# Altium footprint library con-molex.PCBLIB: 368 footprints (part 8 of 26)
Each footprint in its own frame and in the unit in brackets; x right, y up, seen from the top. Pads: shape width x height; smd on the part's side, far side on the other; paste and mask are expansions set on the pad; w line width, h text height; cw(c..) or ccw(c..) is an arc to the next point about the centre after c.
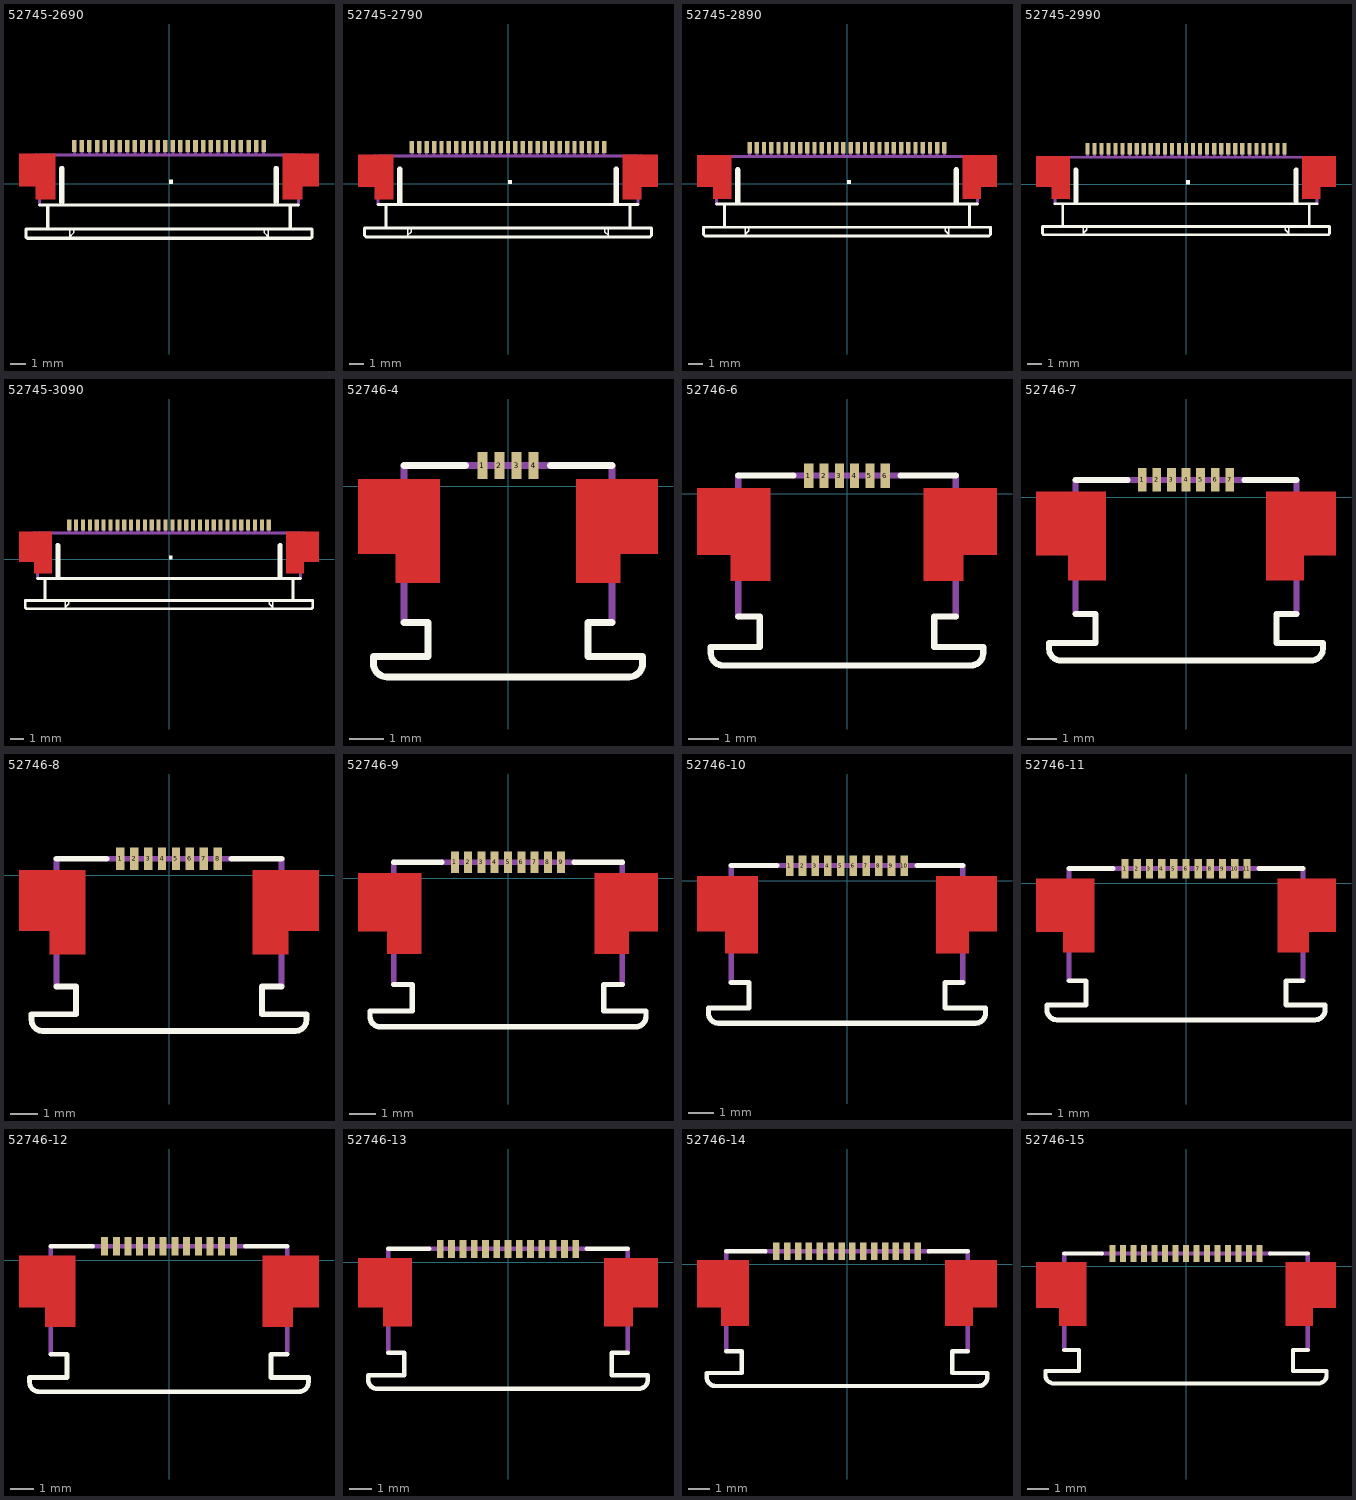
[diagram p7: the footprints below, top view; thin cyan lines are the x and y axes]

## 52745-2690 [mil]
pads (26):
  rect 11.81x31.5 smd: 1(-246.06,98.43) 2(-226.38,98.43) 3(-206.69,98.43) 4(-187.01,98.43) 5(-167.32,98.43) 6(-147.64,98.43) 7(-127.95,98.43) 8(-108.27,98.43) 9(-88.58,98.43) 10(-68.9,98.43) 11(-49.21,98.43) 12(-29.53,98.43) 13(-9.84,98.43) 14(9.84,98.43) 15(29.53,98.43) 16(49.21,98.43) 17(68.9,98.43) 18(88.58,98.43) 19(108.27,98.43) 20(127.95,98.43) 21(147.64,98.43) 22(167.32,98.43) 23(187.01,98.43) 24(206.69,98.43) 25(226.38,98.43) 26(246.06,98.43)
Top Layer:
  rectangle: -389.76,-7.87 -295.28,78.74
  rectangle: -346.46,-41.34 -295.28,-7.87
  rectangle: 295.28,-41.34 346.46,-7.87
  rectangle: 295.28,-7.87 389.76,78.74
Top Overlay:
  region: 0,0 10,0 10,10 0,10
  lines w4: -257.87,-122.05 -257.87,-137.8 -248.03,-127.95 -248.03,-122.05 ; 248.03,-122.05 248.03,-127.95 257.87,-137.8 257.87,-122.05
  lines w8: -336.61,-55.12 336.61,-55.12 ; -314.96,-114.17 -314.96,-59.06 ; -281.5,-49.21 -281.5,39.37 cw(c-278.55,39.37) -275.59,39.37 -275.59,-49.21 ; 275.59,-49.21 275.59,39.37 cw(c278.55,39.37) 281.5,39.37 281.5,-49.21 ; 314.96,-114.17 314.96,-59.06 ; -372.05,-137.8 -372.05,-118.11 372.05,-118.11 372.05,-137.8 368.11,-141.73 -368.11,-141.73 -372.05,-137.8
Top Paste:
  region: 381.89,72.83 303.15,72.83 303.15,-1.97 381.89,-1.97
  rectangle: -381.89,-1.97 -303.15,72.83
Top Solder:
  region: 389.76,78.74 344.49,78.74 344.49,-7.87 389.76,-7.87
  region: 346.46,78.74 295.28,78.74 295.28,-41.34 346.46,-41.34
  rectangle: -389.76,-7.87 -344.49,78.74
  rectangle: -346.46,-41.34 -295.28,78.74
Mechanical 16:
  rectangle: -250,78.74 -242.13,106.3
  rectangle: -230.32,78.74 -222.44,106.3
  rectangle: -210.63,78.74 -202.76,106.3
  rectangle: -190.94,78.74 -183.07,106.3
  rectangle: -171.26,78.74 -163.39,106.3
  rectangle: -151.57,78.74 -143.7,106.3
  rectangle: -131.89,78.74 -124.02,106.3
  rectangle: -112.2,78.74 -104.33,106.3
  rectangle: -92.52,78.74 -84.65,106.3
  rectangle: -72.83,78.74 -64.96,106.3
  rectangle: -53.15,78.74 -45.28,106.3
  rectangle: -33.46,78.74 -25.59,106.3
  rectangle: -13.78,78.74 -5.91,106.3
  rectangle: 5.91,78.74 13.78,106.3
  rectangle: 25.59,78.74 33.46,106.3
  rectangle: 45.28,78.74 53.15,106.3
  rectangle: 64.96,78.74 72.83,106.3
  rectangle: 84.65,78.74 92.52,106.3
  rectangle: 104.33,78.74 112.2,106.3
  rectangle: 124.02,78.74 131.89,106.3
  rectangle: 143.7,78.74 151.57,106.3
  rectangle: 163.39,78.74 171.26,106.3
  rectangle: 183.07,78.74 190.94,106.3
  rectangle: 202.76,78.74 210.63,106.3
  rectangle: 222.44,78.74 230.32,106.3
  rectangle: 242.13,78.74 250,106.3
  lines w4: -342.52,74.8 -342.52,27.56 -372.05,27.56 -372.05,35.43 -350.39,35.43 -348.43,37.4 -348.43,57.09 -372.05,57.09 -372.05,64.96 -348.43,64.96 -348.43,76.77 -342.52,76.77 ; 342.52,74.8 342.52,27.56 372.05,27.56 372.05,35.43 350.39,35.43 348.43,37.4 348.43,57.09 372.05,57.09 372.05,64.96 348.43,64.96 348.43,76.77 342.52,76.77
  lines w8: -336.61,-55.12 -336.61,74.8 336.61,74.8 336.61,-55.12

## 52745-2790 [mil]
pads (27):
  rect 11.81x31.5 smd: 1(-255.91,98.43) 2(-236.22,98.43) 3(-216.54,98.43) 4(-196.85,98.43) 5(-177.17,98.43) 6(-157.48,98.43) 7(-137.8,98.43) 8(-118.11,98.43) 9(-98.43,98.43) 10(-78.74,98.43) 11(-59.06,98.43) 12(-39.37,98.43) 13(-19.69,98.43) 14(0,98.43) 15(19.69,98.43) 16(39.37,98.43) 17(59.06,98.43) 18(78.74,98.43) 19(98.43,98.43) 20(118.11,98.43) 21(137.8,98.43) 22(157.48,98.43) 23(177.17,98.43) 24(196.85,98.43) 25(216.54,98.43) 26(236.22,98.43) 27(255.91,98.43)
Top Layer:
  rectangle: -399.61,-7.87 -305.12,78.74
  rectangle: -356.3,-41.34 -305.12,-7.87
  rectangle: 305.12,-41.34 356.3,-7.87
  rectangle: 305.12,-7.87 399.61,78.74
Top Overlay:
  region: 0,0 10,0 10,10 0,10
  lines w4: -267.72,-122.05 -267.72,-137.8 -257.87,-127.95 -257.87,-122.05 ; 257.87,-122.05 257.87,-127.95 267.72,-137.8 267.72,-122.05
  lines w8: -346.46,-55.12 346.46,-55.12 ; -324.8,-114.17 -324.8,-59.06 ; -291.34,-49.21 -291.34,39.37 cw(c-288.38,39.37) -285.43,39.37 -285.43,-49.21 ; 285.43,-49.21 285.43,39.37 cw(c288.38,39.37) 291.34,39.37 291.34,-49.21 ; 324.8,-114.17 324.8,-59.06 ; -381.89,-137.8 -381.89,-118.11 381.89,-118.11 381.89,-137.8 377.95,-141.73 -377.95,-141.73 -381.89,-137.8
Top Paste:
  region: 391.73,72.83 312.99,72.83 312.99,-1.97 391.73,-1.97
  rectangle: -391.73,-1.97 -312.99,72.83
Top Solder:
  region: 399.61,78.74 354.33,78.74 354.33,-7.87 399.61,-7.87
  region: 356.3,78.74 305.12,78.74 305.12,-41.34 356.3,-41.34
  rectangle: -399.61,-7.87 -354.33,78.74
  rectangle: -356.3,-41.34 -305.12,78.74
Mechanical 16:
  rectangle: -259.84,78.74 -251.97,106.3
  rectangle: -240.16,78.74 -232.28,106.3
  rectangle: -220.47,78.74 -212.6,106.3
  rectangle: -200.79,78.74 -192.91,106.3
  rectangle: -181.1,78.74 -173.23,106.3
  rectangle: -161.42,78.74 -153.54,106.3
  rectangle: -141.73,78.74 -133.86,106.3
  rectangle: -122.05,78.74 -114.17,106.3
  rectangle: -102.36,78.74 -94.49,106.3
  rectangle: -82.68,78.74 -74.8,106.3
  rectangle: -62.99,78.74 -55.12,106.3
  rectangle: -43.31,78.74 -35.43,106.3
  rectangle: -23.62,78.74 -15.75,106.3
  rectangle: -3.94,78.74 3.94,106.3
  rectangle: 15.75,78.74 23.62,106.3
  rectangle: 35.43,78.74 43.31,106.3
  rectangle: 55.12,78.74 62.99,106.3
  rectangle: 74.8,78.74 82.68,106.3
  rectangle: 94.49,78.74 102.36,106.3
  rectangle: 114.17,78.74 122.05,106.3
  rectangle: 133.86,78.74 141.73,106.3
  rectangle: 153.54,78.74 161.42,106.3
  rectangle: 173.23,78.74 181.1,106.3
  rectangle: 192.91,78.74 200.79,106.3
  rectangle: 212.6,78.74 220.47,106.3
  rectangle: 232.28,78.74 240.16,106.3
  rectangle: 251.97,78.74 259.84,106.3
  lines w4: -352.36,74.8 -352.36,27.56 -381.89,27.56 -381.89,35.43 -360.24,35.43 -358.27,37.4 -358.27,57.09 -381.89,57.09 -381.89,64.96 -358.27,64.96 -358.27,76.77 -352.36,76.77 ; 352.36,74.8 352.36,27.56 381.89,27.56 381.89,35.43 360.24,35.43 358.27,37.4 358.27,57.09 381.89,57.09 381.89,64.96 358.27,64.96 358.27,76.77 352.36,76.77
  lines w8: -346.46,-55.12 -346.46,74.8 346.46,74.8 346.46,-55.12

## 52745-2890 [mil]
pads (28):
  rect 11.81x31.5 smd: 1(-265.75,98.43) 2(-246.06,98.43) 3(-226.38,98.43) 4(-206.69,98.43) 5(-187.01,98.43) 6(-167.32,98.43) 7(-147.64,98.43) 8(-127.95,98.43) 9(-108.27,98.43) 10(-88.58,98.43) 11(-68.9,98.43) 12(-49.21,98.43) 13(-29.53,98.43) 14(-9.84,98.43) 15(9.84,98.43) 16(29.53,98.43) 17(49.21,98.43) 18(68.9,98.43) 19(88.58,98.43) 20(108.27,98.43) 21(127.95,98.43) 22(147.64,98.43) 23(167.32,98.43) 24(187.01,98.43) 25(206.69,98.43) 26(226.38,98.43) 27(246.06,98.43) 28(265.75,98.43)
Top Layer:
  rectangle: -409.45,-7.87 -314.96,78.74
  rectangle: -366.14,-41.34 -314.96,-7.87
  rectangle: 314.96,-41.34 366.14,-7.87
  rectangle: 314.96,-7.87 409.45,78.74
Top Overlay:
  region: 0,0 10,0 10,10 0,10
  lines w4: -277.56,-122.05 -277.56,-137.8 -267.72,-127.95 -267.72,-122.05 ; 267.72,-122.05 267.72,-127.95 277.56,-137.8 277.56,-122.05
  lines w8: -356.3,-55.12 356.3,-55.12 ; -334.65,-114.17 -334.65,-59.06 ; -301.18,-49.21 -301.18,39.37 cw(c-298.23,39.37) -295.28,39.37 -295.28,-49.21 ; 295.28,-49.21 295.28,39.37 cw(c298.23,39.37) 301.18,39.37 301.18,-49.21 ; 334.65,-114.17 334.65,-59.06 ; -391.73,-137.8 -391.73,-118.11 391.73,-118.11 391.73,-137.8 387.8,-141.73 -387.8,-141.73 -391.73,-137.8
Top Paste:
  region: 401.57,72.83 322.83,72.83 322.83,-1.97 401.57,-1.97
  rectangle: -401.57,-1.97 -322.83,72.83
Top Solder:
  region: 409.45,78.74 364.17,78.74 364.17,-7.87 409.45,-7.87
  region: 366.14,78.74 314.96,78.74 314.96,-41.34 366.14,-41.34
  rectangle: -409.45,-7.87 -364.17,78.74
  rectangle: -366.14,-41.34 -314.96,78.74
Mechanical 16:
  rectangle: -269.69,78.74 -261.81,106.3
  rectangle: -250,78.74 -242.13,106.3
  rectangle: -230.32,78.74 -222.44,106.3
  rectangle: -210.63,78.74 -202.76,106.3
  rectangle: -190.94,78.74 -183.07,106.3
  rectangle: -171.26,78.74 -163.39,106.3
  rectangle: -151.57,78.74 -143.7,106.3
  rectangle: -131.89,78.74 -124.02,106.3
  rectangle: -112.2,78.74 -104.33,106.3
  rectangle: -92.52,78.74 -84.65,106.3
  rectangle: -72.83,78.74 -64.96,106.3
  rectangle: -53.15,78.74 -45.28,106.3
  rectangle: -33.46,78.74 -25.59,106.3
  rectangle: -13.78,78.74 -5.91,106.3
  rectangle: 5.91,78.74 13.78,106.3
  rectangle: 25.59,78.74 33.46,106.3
  rectangle: 45.28,78.74 53.15,106.3
  rectangle: 64.96,78.74 72.83,106.3
  rectangle: 84.65,78.74 92.52,106.3
  rectangle: 104.33,78.74 112.2,106.3
  rectangle: 124.02,78.74 131.89,106.3
  rectangle: 143.7,78.74 151.57,106.3
  rectangle: 163.39,78.74 171.26,106.3
  rectangle: 183.07,78.74 190.94,106.3
  rectangle: 202.76,78.74 210.63,106.3
  rectangle: 222.44,78.74 230.32,106.3
  rectangle: 242.13,78.74 250,106.3
  rectangle: 261.81,78.74 269.69,106.3
  lines w4: -362.2,74.8 -362.2,27.56 -391.73,27.56 -391.73,35.43 -370.08,35.43 -368.11,37.4 -368.11,57.09 -391.73,57.09 -391.73,64.96 -368.11,64.96 -368.11,76.77 -362.2,76.77 ; 362.2,74.8 362.2,27.56 391.73,27.56 391.73,35.43 370.08,35.43 368.11,37.4 368.11,57.09 391.73,57.09 391.73,64.96 368.11,64.96 368.11,76.77 362.2,76.77
  lines w8: -356.3,-55.12 -356.3,74.8 356.3,74.8 356.3,-55.12

## 52745-2990 [mil]
pads (29):
  rect 11.81x31.5 smd: 1(-275.59,98.43) 2(-255.91,98.43) 3(-236.22,98.43) 4(-216.54,98.43) 5(-196.85,98.43) 6(-177.17,98.43) 7(-157.48,98.43) 8(-137.8,98.43) 9(-118.11,98.43) 10(-98.43,98.43) 11(-78.74,98.43) 12(-59.06,98.43) 13(-39.37,98.43) 14(-19.69,98.43) 15(0,98.43) 16(19.69,98.43) 17(39.37,98.43) 18(59.06,98.43) 19(78.74,98.43) 20(98.43,98.43) 21(118.11,98.43) 22(137.8,98.43) 23(157.48,98.43) 24(177.17,98.43) 25(196.85,98.43) 26(216.54,98.43) 27(236.22,98.43) 28(255.91,98.43) 29(275.59,98.43)
Top Layer:
  rectangle: -419.29,-7.87 -324.8,78.74
  rectangle: -375.98,-41.34 -324.8,-7.87
  rectangle: 324.8,-41.34 375.98,-7.87
  rectangle: 324.8,-7.87 419.29,78.74
Top Overlay:
  region: 0,0 10,0 10,10 0,10
  lines w4: -287.4,-122.05 -287.4,-137.8 -277.56,-127.95 -277.56,-122.05 ; 277.56,-122.05 277.56,-127.95 287.4,-137.8 287.4,-122.05
  lines w8: -366.14,-55.12 366.14,-55.12 ; -344.49,-114.17 -344.49,-59.06 ; -311.02,-49.21 -311.02,39.37 cw(c-308.07,39.37) -305.12,39.37 -305.12,-49.21 ; 305.12,-49.21 305.12,39.37 cw(c308.07,39.37) 311.02,39.37 311.02,-49.21 ; 344.49,-114.17 344.49,-59.06 ; -401.57,-137.8 -401.57,-118.11 401.57,-118.11 401.57,-137.8 397.64,-141.73 -397.64,-141.73 -401.57,-137.8
Top Paste:
  region: 411.42,72.83 332.68,72.83 332.68,-1.97 411.42,-1.97
  rectangle: -411.42,-1.97 -332.68,72.83
Top Solder:
  region: 419.29,78.74 374.02,78.74 374.02,-7.87 419.29,-7.87
  region: 375.98,78.74 324.8,78.74 324.8,-41.34 375.98,-41.34
  rectangle: -419.29,-7.87 -374.02,78.74
  rectangle: -375.98,-41.34 -324.8,78.74
Mechanical 16:
  rectangle: -279.53,78.74 -271.65,106.3
  rectangle: -259.84,78.74 -251.97,106.3
  rectangle: -240.16,78.74 -232.28,106.3
  rectangle: -220.47,78.74 -212.6,106.3
  rectangle: -200.79,78.74 -192.91,106.3
  rectangle: -181.1,78.74 -173.23,106.3
  rectangle: -161.42,78.74 -153.54,106.3
  rectangle: -141.73,78.74 -133.86,106.3
  rectangle: -122.05,78.74 -114.17,106.3
  rectangle: -102.36,78.74 -94.49,106.3
  rectangle: -82.68,78.74 -74.8,106.3
  rectangle: -62.99,78.74 -55.12,106.3
  rectangle: -43.31,78.74 -35.43,106.3
  rectangle: -23.62,78.74 -15.75,106.3
  rectangle: -3.94,78.74 3.94,106.3
  rectangle: 15.75,78.74 23.62,106.3
  rectangle: 35.43,78.74 43.31,106.3
  rectangle: 55.12,78.74 62.99,106.3
  rectangle: 74.8,78.74 82.68,106.3
  rectangle: 94.49,78.74 102.36,106.3
  rectangle: 114.17,78.74 122.05,106.3
  rectangle: 133.86,78.74 141.73,106.3
  rectangle: 153.54,78.74 161.42,106.3
  rectangle: 173.23,78.74 181.1,106.3
  rectangle: 192.91,78.74 200.79,106.3
  rectangle: 212.6,78.74 220.47,106.3
  rectangle: 232.28,78.74 240.16,106.3
  rectangle: 251.97,78.74 259.84,106.3
  rectangle: 271.65,78.74 279.53,106.3
  lines w4: -372.05,74.8 -372.05,27.56 -401.57,27.56 -401.57,35.43 -379.92,35.43 -377.95,37.4 -377.95,57.09 -401.57,57.09 -401.57,64.96 -377.95,64.96 -377.95,76.77 -372.05,76.77 ; 372.05,74.8 372.05,27.56 401.57,27.56 401.57,35.43 379.92,35.43 377.95,37.4 377.95,57.09 401.57,57.09 401.57,64.96 377.95,64.96 377.95,76.77 372.05,76.77
  lines w8: -366.14,-55.12 -366.14,74.8 366.14,74.8 366.14,-55.12

## 52745-3090 [mil]
pads (30):
  rect 11.81x31.5 smd: 1(-285.43,98.43) 2(-265.75,98.43) 3(-246.06,98.43) 4(-226.38,98.43) 5(-206.69,98.43) 6(-187.01,98.43) 7(-167.32,98.43) 8(-147.64,98.43) 9(-127.95,98.43) 10(-108.27,98.43) 11(-88.58,98.43) 12(-68.9,98.43) 13(-49.21,98.43) 14(-29.53,98.43) 15(-9.84,98.43) 16(9.84,98.43) 17(29.53,98.43) 18(49.21,98.43) 19(68.9,98.43) 20(88.58,98.43) 21(108.27,98.43) 22(127.95,98.43) 23(147.64,98.43) 24(167.32,98.43) 25(187.01,98.43) 26(206.69,98.43) 27(226.38,98.43) 28(246.06,98.43) 29(265.75,98.43) 30(285.43,98.43)
Top Layer:
  rectangle: -429.13,-7.87 -334.65,78.74
  rectangle: -385.83,-41.34 -334.65,-7.87
  rectangle: 334.65,-41.34 385.83,-7.87
  rectangle: 334.65,-7.87 429.13,78.74
Top Overlay:
  region: 0,0 10,0 10,10 0,10
  lines w4: -297.24,-122.05 -297.24,-137.8 -287.4,-127.95 -287.4,-122.05 ; 287.4,-122.05 287.4,-127.95 297.24,-137.8 297.24,-122.05
  lines w8: -375.98,-55.12 375.98,-55.12 ; -354.33,-114.17 -354.33,-59.06 ; -320.87,-49.21 -320.87,39.37 cw(c-317.92,39.37) -314.96,39.37 -314.96,-49.21 ; 314.96,-49.21 314.96,39.37 cw(c317.92,39.37) 320.87,39.37 320.87,-49.21 ; 354.33,-114.17 354.33,-59.06 ; -411.42,-137.8 -411.42,-118.11 411.42,-118.11 411.42,-137.8 407.48,-141.73 -407.48,-141.73 -411.42,-137.8
Top Paste:
  region: 421.26,72.83 342.52,72.83 342.52,-1.97 421.26,-1.97
  rectangle: -421.26,-1.97 -342.52,72.83
Top Solder:
  region: 429.13,78.74 383.86,78.74 383.86,-7.87 429.13,-7.87
  region: 385.83,78.74 334.65,78.74 334.65,-41.34 385.83,-41.34
  rectangle: -429.13,-7.87 -383.86,78.74
  rectangle: -385.83,-41.34 -334.65,78.74
Mechanical 16:
  rectangle: -289.37,78.74 -281.5,106.3
  rectangle: -269.69,78.74 -261.81,106.3
  rectangle: -250,78.74 -242.13,106.3
  rectangle: -230.32,78.74 -222.44,106.3
  rectangle: -210.63,78.74 -202.76,106.3
  rectangle: -190.94,78.74 -183.07,106.3
  rectangle: -171.26,78.74 -163.39,106.3
  rectangle: -151.57,78.74 -143.7,106.3
  rectangle: -131.89,78.74 -124.02,106.3
  rectangle: -112.2,78.74 -104.33,106.3
  rectangle: -92.52,78.74 -84.65,106.3
  rectangle: -72.83,78.74 -64.96,106.3
  rectangle: -53.15,78.74 -45.28,106.3
  rectangle: -33.46,78.74 -25.59,106.3
  rectangle: -13.78,78.74 -5.91,106.3
  rectangle: 5.91,78.74 13.78,106.3
  rectangle: 25.59,78.74 33.46,106.3
  rectangle: 45.28,78.74 53.15,106.3
  rectangle: 64.96,78.74 72.83,106.3
  rectangle: 84.65,78.74 92.52,106.3
  rectangle: 104.33,78.74 112.2,106.3
  rectangle: 124.02,78.74 131.89,106.3
  rectangle: 143.7,78.74 151.57,106.3
  rectangle: 163.39,78.74 171.26,106.3
  rectangle: 183.07,78.74 190.94,106.3
  rectangle: 202.76,78.74 210.63,106.3
  rectangle: 222.44,78.74 230.32,106.3
  rectangle: 242.13,78.74 250,106.3
  rectangle: 261.81,78.74 269.69,106.3
  rectangle: 281.5,78.74 289.37,106.3
  lines w4: -381.89,74.8 -381.89,27.56 -411.42,27.56 -411.42,35.43 -389.76,35.43 -387.8,37.4 -387.8,57.09 -411.42,57.09 -411.42,64.96 -387.8,64.96 -387.8,76.77 -381.89,76.77 ; 381.89,74.8 381.89,27.56 411.42,27.56 411.42,35.43 389.76,35.43 387.8,37.4 387.8,57.09 411.42,57.09 411.42,64.96 387.8,64.96 387.8,76.77 381.89,76.77
  lines w8: -375.98,-55.12 -375.98,74.8 375.98,74.8 375.98,-55.12

## 52746-4 [mil]
pads (4):
  rect 11.81x31.5 smd: 1(-29.53,23.62) 2(-9.84,23.62) 3(9.84,23.62) 4(29.53,23.62)
Top Layer:
  rectangle: -173.23,-78.74 -78.74,7.87
  rectangle: -129.92,-112.2 -78.74,-78.74
  rectangle: 78.74,-78.74 173.23,7.87
  rectangle: 78.74,-112.2 129.92,-78.74
Top Overlay:
  lines w8: -120.08,-157.48 -92.52,-157.48 -92.52,-196.85 -155.51,-196.85 -155.51,-204.72 ccw(c-139.76,-204.72) -139.76,-220.47 139.76,-220.47 ccw(c139.76,-204.72) 155.51,-204.72 155.51,-196.85 92.52,-196.85 92.52,-157.48 120.08,-157.48 ; -120.08,23.62 -49.21,23.62 ; 49.21,23.62 120.08,23.62
Top Paste:
  rectangle: -168.31,-74.8 -82.68,2.95
  rectangle: -125.98,-108.27 -82.68,-74.8
  rectangle: 82.68,-74.8 168.31,2.95
  rectangle: 82.68,-108.27 125.98,-74.8
Top Solder:
  rectangle: -173.23,-78.74 -78.74,7.87
  rectangle: -129.92,-112.2 -78.74,-78.74
  rectangle: 78.74,-78.74 173.23,7.87
  rectangle: 78.74,-112.2 129.92,-78.74
  rectangle: -36.42,6.89 -22.64,40.35
  rectangle: -16.73,6.89 -2.95,40.35
  rectangle: 2.95,6.89 16.73,40.35
  rectangle: 22.64,6.89 36.42,40.35
Mechanical 16:
  lines w8: -120.08,-157.48 -120.08,23.62 ; -49.21,23.62 49.21,23.62 ; 120.08,-157.48 120.08,23.62
  lines w19.69: -157.48,-55.12 -125.98,-55.12 -125.98,-9.84 -157.48,-9.84 ; 157.48,-55.12 125.98,-55.12 125.98,-9.84 157.48,-9.84

## 52746-6 [mil]
pads (6):
  rect 11.81x31.5 smd: 1(-49.21,23.62) 2(-29.53,23.62) 3(-9.84,23.62) 4(9.84,23.62) 5(29.53,23.62) 6(49.21,23.62)
Top Layer:
  rectangle: -192.91,-78.74 -98.43,7.87
  rectangle: -149.61,-112.2 -98.43,-78.74
  rectangle: 98.43,-78.74 192.91,7.87
  rectangle: 98.43,-112.2 149.61,-78.74
Top Overlay:
  lines w8: -139.76,-157.48 -112.2,-157.48 -112.2,-196.85 -175.2,-196.85 -175.2,-204.72 ccw(c-159.45,-204.72) -159.45,-220.47 159.45,-220.47 ccw(c159.45,-204.72) 175.2,-204.72 175.2,-196.85 112.2,-196.85 112.2,-157.48 139.76,-157.48 ; -139.76,23.62 -68.9,23.62 ; 68.9,23.62 139.76,23.62
Top Paste:
  rectangle: -187.99,-74.8 -102.36,2.95
  rectangle: -145.67,-108.27 -102.36,-74.8
  rectangle: 102.36,-74.8 187.99,2.95
  rectangle: 102.36,-108.27 145.67,-74.8
Top Solder:
  rectangle: -192.91,-78.74 -98.43,7.87
  rectangle: -149.61,-112.2 -98.43,-78.74
  rectangle: 98.43,-78.74 192.91,7.87
  rectangle: 98.43,-112.2 149.61,-78.74
  rectangle: -56.1,6.89 -42.32,40.35
  rectangle: -36.42,6.89 -22.64,40.35
  rectangle: -16.73,6.89 -2.95,40.35
  rectangle: 2.95,6.89 16.73,40.35
  rectangle: 22.64,6.89 36.42,40.35
  rectangle: 42.32,6.89 56.1,40.35
Mechanical 16:
  lines w8: -139.76,-157.48 -139.76,23.62 ; -68.9,23.62 68.9,23.62 ; 139.76,-157.48 139.76,23.62
  lines w19.69: -177.17,-55.12 -145.67,-55.12 -145.67,-9.84 -177.17,-9.84 ; 177.17,-55.12 145.67,-55.12 145.67,-9.84 177.17,-9.84

## 52746-7 [mil]
pads (7):
  rect 11.81x31.5 smd: 1(-59.06,23.62) 2(-39.37,23.62) 3(-19.69,23.62) 4(0,23.62) 5(19.69,23.62) 6(39.37,23.62) 7(59.06,23.62)
Top Layer:
  rectangle: -202.76,-78.74 -108.27,7.87
  rectangle: -159.45,-112.2 -108.27,-78.74
  rectangle: 108.27,-78.74 202.76,7.87
  rectangle: 108.27,-112.2 159.45,-78.74
Top Overlay:
  lines w8: -149.61,-157.48 -122.05,-157.48 -122.05,-196.85 -185.04,-196.85 -185.04,-204.72 ccw(c-169.29,-204.72) -169.29,-220.47 169.29,-220.47 ccw(c169.29,-204.72) 185.04,-204.72 185.04,-196.85 122.05,-196.85 122.05,-157.48 149.61,-157.48 ; -149.61,23.62 -78.74,23.62 ; 78.74,23.62 149.61,23.62
Top Paste:
  rectangle: -197.83,-74.8 -112.2,2.95
  rectangle: -155.51,-108.27 -112.2,-74.8
  rectangle: 112.2,-74.8 197.83,2.95
  rectangle: 112.2,-108.27 155.51,-74.8
Top Solder:
  rectangle: -202.76,-78.74 -108.27,7.87
  rectangle: -159.45,-112.2 -108.27,-78.74
  rectangle: 108.27,-78.74 202.76,7.87
  rectangle: 108.27,-112.2 159.45,-78.74
  rectangle: -65.94,6.89 -52.17,40.35
  rectangle: -46.26,6.89 -32.48,40.35
  rectangle: -26.57,6.89 -12.8,40.35
  rectangle: -6.89,6.89 6.89,40.35
  rectangle: 12.8,6.89 26.57,40.35
  rectangle: 32.48,6.89 46.26,40.35
  rectangle: 52.17,6.89 65.94,40.35
Mechanical 16:
  lines w8: -149.61,-157.48 -149.61,23.62 ; -78.74,23.62 78.74,23.62 ; 149.61,-157.48 149.61,23.62
  lines w19.69: -187.01,-55.12 -155.51,-55.12 -155.51,-9.84 -187.01,-9.84 ; 187.01,-55.12 155.51,-55.12 155.51,-9.84 187.01,-9.84

## 52746-8 [mil]
pads (8):
  rect 11.81x31.5 smd: 1(-68.9,23.62) 2(-49.21,23.62) 3(-29.53,23.62) 4(-9.84,23.62) 5(9.84,23.62) 6(29.53,23.62) 7(49.21,23.62) 8(68.9,23.62)
Top Layer:
  rectangle: -212.6,-78.74 -118.11,7.87
  rectangle: -169.29,-112.2 -118.11,-78.74
  rectangle: 118.11,-78.74 212.6,7.87
  rectangle: 118.11,-112.2 169.29,-78.74
Top Overlay:
  lines w8: -159.45,-157.48 -131.89,-157.48 -131.89,-196.85 -194.88,-196.85 -194.88,-204.72 ccw(c-179.13,-204.72) -179.13,-220.47 179.13,-220.47 ccw(c179.13,-204.72) 194.88,-204.72 194.88,-196.85 131.89,-196.85 131.89,-157.48 159.45,-157.48 ; -159.45,23.62 -88.58,23.62 ; 88.58,23.62 159.45,23.62
Top Paste:
  rectangle: -207.68,-74.8 -122.05,2.95
  rectangle: -165.35,-108.27 -122.05,-74.8
  rectangle: 122.05,-74.8 207.68,2.95
  rectangle: 122.05,-108.27 165.35,-74.8
Top Solder:
  rectangle: -212.6,-78.74 -118.11,7.87
  rectangle: -169.29,-112.2 -118.11,-78.74
  rectangle: 118.11,-78.74 212.6,7.87
  rectangle: 118.11,-112.2 169.29,-78.74
  rectangle: -75.79,6.89 -62.01,40.35
  rectangle: -56.1,6.89 -42.32,40.35
  rectangle: -36.42,6.89 -22.64,40.35
  rectangle: -16.73,6.89 -2.95,40.35
  rectangle: 2.95,6.89 16.73,40.35
  rectangle: 22.64,6.89 36.42,40.35
  rectangle: 42.32,6.89 56.1,40.35
  rectangle: 62.01,6.89 75.79,40.35
Mechanical 16:
  lines w8: -159.45,-157.48 -159.45,23.62 ; -88.58,23.62 88.58,23.62 ; 159.45,-157.48 159.45,23.62
  lines w19.69: -196.85,-55.12 -165.35,-55.12 -165.35,-9.84 -196.85,-9.84 ; 196.85,-55.12 165.35,-55.12 165.35,-9.84 196.85,-9.84

## 52746-9 [mil]
pads (9):
  rect 11.81x31.5 smd: 1(-78.74,23.62) 2(-59.06,23.62) 3(-39.37,23.62) 4(-19.69,23.62) 5(0,23.62) 6(19.69,23.62) 7(39.37,23.62) 8(59.06,23.62) 9(78.74,23.62)
Top Layer:
  rectangle: -222.44,-78.74 -127.95,7.87
  rectangle: -179.13,-112.2 -127.95,-78.74
  rectangle: 127.95,-78.74 222.44,7.87
  rectangle: 127.95,-112.2 179.13,-78.74
Top Overlay:
  lines w8: -169.29,-157.48 -141.73,-157.48 -141.73,-196.85 -204.72,-196.85 -204.72,-204.72 ccw(c-188.97,-204.72) -188.98,-220.47 188.98,-220.47 ccw(c188.97,-204.72) 204.72,-204.72 204.72,-196.85 141.73,-196.85 141.73,-157.48 169.29,-157.48 ; -169.29,23.62 -98.43,23.62 ; 98.43,23.62 169.29,23.62
Top Paste:
  rectangle: -217.52,-74.8 -131.89,2.95
  rectangle: -175.2,-108.27 -131.89,-74.8
  rectangle: 131.89,-74.8 217.52,2.95
  rectangle: 131.89,-108.27 175.2,-74.8
Top Solder:
  rectangle: -222.44,-78.74 -127.95,7.87
  rectangle: -179.13,-112.2 -127.95,-78.74
  rectangle: 127.95,-78.74 222.44,7.87
  rectangle: 127.95,-112.2 179.13,-78.74
  rectangle: -85.63,6.89 -71.85,40.35
  rectangle: -65.94,6.89 -52.17,40.35
  rectangle: -46.26,6.89 -32.48,40.35
  rectangle: -26.57,6.89 -12.8,40.35
  rectangle: -6.89,6.89 6.89,40.35
  rectangle: 12.8,6.89 26.57,40.35
  rectangle: 32.48,6.89 46.26,40.35
  rectangle: 52.17,6.89 65.94,40.35
  rectangle: 71.85,6.89 85.63,40.35
Mechanical 16:
  lines w8: -169.29,-157.48 -169.29,23.62 ; -98.43,23.62 98.43,23.62 ; 169.29,-157.48 169.29,23.62
  lines w19.69: -206.69,-55.12 -175.2,-55.12 -175.2,-9.84 -206.69,-9.84 ; 206.69,-55.12 175.2,-55.12 175.2,-9.84 206.69,-9.84

## 52746-10 [mil]
pads (10):
  rect 11.81x31.5 smd: 1(-88.58,23.62) 2(-68.9,23.62) 3(-49.21,23.62) 4(-29.53,23.62) 5(-9.84,23.62) 6(9.84,23.62) 7(29.53,23.62) 8(49.21,23.62) 9(68.9,23.62) 10(88.58,23.62)
Top Layer:
  rectangle: -232.28,-78.74 -137.8,7.87
  rectangle: -188.98,-112.2 -137.8,-78.74
  rectangle: 137.8,-78.74 232.28,7.87
  rectangle: 137.8,-112.2 188.98,-78.74
Top Overlay:
  lines w8: -179.13,-157.48 -151.57,-157.48 -151.57,-196.85 -214.57,-196.85 -214.57,-204.72 ccw(c-198.82,-204.72) -198.82,-220.47 198.82,-220.47 ccw(c198.82,-204.72) 214.57,-204.72 214.57,-196.85 151.57,-196.85 151.57,-157.48 179.13,-157.48 ; -179.13,23.62 -108.27,23.62 ; 108.27,23.62 179.13,23.62
Top Paste:
  rectangle: -227.36,-74.8 -141.73,2.95
  rectangle: -185.04,-108.27 -141.73,-74.8
  rectangle: 141.73,-74.8 227.36,2.95
  rectangle: 141.73,-108.27 185.04,-74.8
Top Solder:
  rectangle: -232.28,-78.74 -137.8,7.87
  rectangle: -188.98,-112.2 -137.8,-78.74
  rectangle: 137.8,-78.74 232.28,7.87
  rectangle: 137.8,-112.2 188.98,-78.74
  rectangle: -95.47,6.89 -81.69,40.35
  rectangle: -75.79,6.89 -62.01,40.35
  rectangle: -56.1,6.89 -42.32,40.35
  rectangle: -36.42,6.89 -22.64,40.35
  rectangle: -16.73,6.89 -2.95,40.35
  rectangle: 2.95,6.89 16.73,40.35
  rectangle: 22.64,6.89 36.42,40.35
  rectangle: 42.32,6.89 56.1,40.35
  rectangle: 62.01,6.89 75.79,40.35
  rectangle: 81.69,6.89 95.47,40.35
Mechanical 16:
  lines w8: -179.13,-157.48 -179.13,23.62 ; -108.27,23.62 108.27,23.62 ; 179.13,-157.48 179.13,23.62
  lines w19.69: -216.54,-55.12 -185.04,-55.12 -185.04,-9.84 -216.54,-9.84 ; 216.54,-55.12 185.04,-55.12 185.04,-9.84 216.54,-9.84

## 52746-11 [mil]
pads (11):
  rect 11.81x31.5 smd: 1(-98.43,23.62) 2(-78.74,23.62) 3(-59.06,23.62) 4(-39.37,23.62) 5(-19.69,23.62) 6(0,23.62) 7(19.69,23.62) 8(39.37,23.62) 9(59.06,23.62) 10(78.74,23.62) 11(98.43,23.62)
Top Layer:
  rectangle: -242.13,-78.74 -147.64,7.87
  rectangle: -198.82,-112.2 -147.64,-78.74
  rectangle: 147.64,-78.74 242.13,7.87
  rectangle: 147.64,-112.2 198.82,-78.74
Top Overlay:
  lines w8: -188.98,-157.48 -161.42,-157.48 -161.42,-196.85 -224.41,-196.85 -224.41,-204.72 ccw(c-208.66,-204.72) -208.66,-220.47 208.66,-220.47 ccw(c208.66,-204.72) 224.41,-204.72 224.41,-196.85 161.42,-196.85 161.42,-157.48 188.98,-157.48 ; -188.98,23.62 -118.11,23.62 ; 118.11,23.62 188.98,23.62
Top Paste:
  rectangle: -237.2,-74.8 -151.57,2.95
  rectangle: -194.88,-108.27 -151.57,-74.8
  rectangle: 151.57,-74.8 237.2,2.95
  rectangle: 151.57,-108.27 194.88,-74.8
Top Solder:
  rectangle: -242.13,-78.74 -147.64,7.87
  rectangle: -198.82,-112.2 -147.64,-78.74
  rectangle: 147.64,-78.74 242.13,7.87
  rectangle: 147.64,-112.2 198.82,-78.74
  rectangle: -105.32,6.89 -91.54,40.35
  rectangle: -85.63,6.89 -71.85,40.35
  rectangle: -65.94,6.89 -52.17,40.35
  rectangle: -46.26,6.89 -32.48,40.35
  rectangle: -26.57,6.89 -12.8,40.35
  rectangle: -6.89,6.89 6.89,40.35
  rectangle: 12.8,6.89 26.57,40.35
  rectangle: 32.48,6.89 46.26,40.35
  rectangle: 52.17,6.89 65.94,40.35
  rectangle: 71.85,6.89 85.63,40.35
  rectangle: 91.54,6.89 105.32,40.35
Mechanical 16:
  lines w8: -188.98,-157.48 -188.98,23.62 ; -118.11,23.62 118.11,23.62 ; 188.98,-157.48 188.98,23.62
  lines w19.69: -226.38,-55.12 -194.88,-55.12 -194.88,-9.84 -226.38,-9.84 ; 226.38,-55.12 194.88,-55.12 194.88,-9.84 226.38,-9.84

## 52746-12 [mil]
pads (12):
  rect 11.81x31.5 smd: 1(-108.27,23.62) 2(-88.58,23.62) 3(-68.9,23.62) 4(-49.21,23.62) 5(-29.53,23.62) 6(-9.84,23.62) 7(9.84,23.62) 8(29.53,23.62) 9(49.21,23.62) 10(68.9,23.62) 11(88.58,23.62) 12(108.27,23.62)
Top Layer:
  rectangle: -251.97,-78.74 -157.48,7.87
  rectangle: -208.66,-112.2 -157.48,-78.74
  rectangle: 157.48,-78.74 251.97,7.87
  rectangle: 157.48,-112.2 208.66,-78.74
Top Overlay:
  lines w8: -198.82,-157.48 -171.26,-157.48 -171.26,-196.85 -234.25,-196.85 -234.25,-204.72 ccw(c-218.5,-204.72) -218.5,-220.47 218.5,-220.47 ccw(c218.5,-204.72) 234.25,-204.72 234.25,-196.85 171.26,-196.85 171.26,-157.48 198.82,-157.48 ; -198.82,23.62 -127.95,23.62 ; 127.95,23.62 198.82,23.62
Top Paste:
  rectangle: -247.05,-74.8 -161.42,2.95
  rectangle: -204.72,-108.27 -161.42,-74.8
  rectangle: 161.42,-74.8 247.05,2.95
  rectangle: 161.42,-108.27 204.72,-74.8
Top Solder:
  rectangle: -251.97,-78.74 -157.48,7.87
  rectangle: -208.66,-112.2 -157.48,-78.74
  rectangle: 157.48,-78.74 251.97,7.87
  rectangle: 157.48,-112.2 208.66,-78.74
  rectangle: -115.16,6.89 -101.38,40.35
  rectangle: -95.47,6.89 -81.69,40.35
  rectangle: -75.79,6.89 -62.01,40.35
  rectangle: -56.1,6.89 -42.32,40.35
  rectangle: -36.42,6.89 -22.64,40.35
  rectangle: -16.73,6.89 -2.95,40.35
  rectangle: 2.95,6.89 16.73,40.35
  rectangle: 22.64,6.89 36.42,40.35
  rectangle: 42.32,6.89 56.1,40.35
  rectangle: 62.01,6.89 75.79,40.35
  rectangle: 81.69,6.89 95.47,40.35
  rectangle: 101.38,6.89 115.16,40.35
Mechanical 16:
  lines w8: -198.82,-157.48 -198.82,23.62 ; -127.95,23.62 127.95,23.62 ; 198.82,-157.48 198.82,23.62
  lines w19.69: -236.22,-55.12 -204.72,-55.12 -204.72,-9.84 -236.22,-9.84 ; 236.22,-55.12 204.72,-55.12 204.72,-9.84 236.22,-9.84

## 52746-13 [mil]
pads (13):
  rect 11.81x31.5 smd: 1(-118.11,23.62) 2(-98.43,23.62) 3(-78.74,23.62) 4(-59.06,23.62) 5(-39.37,23.62) 6(-19.69,23.62) 7(0,23.62) 8(19.69,23.62) 9(39.37,23.62) 10(59.06,23.62) 11(78.74,23.62) 12(98.43,23.62) 13(118.11,23.62)
Top Layer:
  rectangle: -261.81,-78.74 -167.32,7.87
  rectangle: -218.5,-112.2 -167.32,-78.74
  rectangle: 167.32,-78.74 261.81,7.87
  rectangle: 167.32,-112.2 218.5,-78.74
Top Overlay:
  lines w8: -208.66,-157.48 -181.1,-157.48 -181.1,-196.85 -244.09,-196.85 -244.09,-204.72 ccw(c-228.34,-204.72) -228.35,-220.47 228.35,-220.47 ccw(c228.34,-204.72) 244.09,-204.72 244.09,-196.85 181.1,-196.85 181.1,-157.48 208.66,-157.48 ; -208.66,23.62 -137.8,23.62 ; 137.8,23.62 208.66,23.62
Top Paste:
  rectangle: -256.89,-74.8 -171.26,2.95
  rectangle: -214.57,-108.27 -171.26,-74.8
  rectangle: 171.26,-74.8 256.89,2.95
  rectangle: 171.26,-108.27 214.57,-74.8
Top Solder:
  rectangle: -261.81,-78.74 -167.32,7.87
  rectangle: -218.5,-112.2 -167.32,-78.74
  rectangle: 167.32,-78.74 261.81,7.87
  rectangle: 167.32,-112.2 218.5,-78.74
  rectangle: -125,6.89 -111.22,40.35
  rectangle: -105.32,6.89 -91.54,40.35
  rectangle: -85.63,6.89 -71.85,40.35
  rectangle: -65.94,6.89 -52.17,40.35
  rectangle: -46.26,6.89 -32.48,40.35
  rectangle: -26.57,6.89 -12.8,40.35
  rectangle: -6.89,6.89 6.89,40.35
  rectangle: 12.8,6.89 26.57,40.35
  rectangle: 32.48,6.89 46.26,40.35
  rectangle: 52.17,6.89 65.94,40.35
  rectangle: 71.85,6.89 85.63,40.35
  rectangle: 91.54,6.89 105.32,40.35
  rectangle: 111.22,6.89 125,40.35
Mechanical 16:
  lines w8: -208.66,-157.48 -208.66,23.62 ; -137.8,23.62 137.8,23.62 ; 208.66,-157.48 208.66,23.62
  lines w19.69: -246.06,-55.12 -214.57,-55.12 -214.57,-9.84 -246.06,-9.84 ; 246.06,-55.12 214.57,-55.12 214.57,-9.84 246.06,-9.84

## 52746-14 [mil]
pads (14):
  rect 11.81x31.5 smd: 1(-127.95,23.62) 2(-108.27,23.62) 3(-88.58,23.62) 4(-68.9,23.62) 5(-49.21,23.62) 6(-29.53,23.62) 7(-9.84,23.62) 8(9.84,23.62) 9(29.53,23.62) 10(49.21,23.62) 11(68.9,23.62) 12(88.58,23.62) 13(108.27,23.62) 14(127.95,23.62)
Top Layer:
  rectangle: -271.65,-78.74 -177.17,7.87
  rectangle: -228.35,-112.2 -177.17,-78.74
  rectangle: 177.17,-78.74 271.65,7.87
  rectangle: 177.17,-112.2 228.35,-78.74
Top Overlay:
  lines w8: -218.5,-157.48 -190.94,-157.48 -190.94,-196.85 -253.94,-196.85 -253.94,-204.72 ccw(c-238.19,-204.72) -238.19,-220.47 238.19,-220.47 ccw(c238.19,-204.72) 253.94,-204.72 253.94,-196.85 190.94,-196.85 190.94,-157.48 218.5,-157.48 ; -218.5,23.62 -147.64,23.62 ; 147.64,23.62 218.5,23.62
Top Paste:
  rectangle: -266.73,-74.8 -181.1,2.95
  rectangle: -224.41,-108.27 -181.1,-74.8
  rectangle: 181.1,-74.8 266.73,2.95
  rectangle: 181.1,-108.27 224.41,-74.8
Top Solder:
  rectangle: -271.65,-78.74 -177.17,7.87
  rectangle: -228.35,-112.2 -177.17,-78.74
  rectangle: 177.17,-78.74 271.65,7.87
  rectangle: 177.17,-112.2 228.35,-78.74
  rectangle: -134.84,6.89 -121.06,40.35
  rectangle: -115.16,6.89 -101.38,40.35
  rectangle: -95.47,6.89 -81.69,40.35
  rectangle: -75.79,6.89 -62.01,40.35
  rectangle: -56.1,6.89 -42.32,40.35
  rectangle: -36.42,6.89 -22.64,40.35
  rectangle: -16.73,6.89 -2.95,40.35
  rectangle: 2.95,6.89 16.73,40.35
  rectangle: 22.64,6.89 36.42,40.35
  rectangle: 42.32,6.89 56.1,40.35
  rectangle: 62.01,6.89 75.79,40.35
  rectangle: 81.69,6.89 95.47,40.35
  rectangle: 101.38,6.89 115.16,40.35
  rectangle: 121.06,6.89 134.84,40.35
Mechanical 16:
  lines w8: -218.5,-157.48 -218.5,23.62 ; -147.64,23.62 147.64,23.62 ; 218.5,-157.48 218.5,23.62
  lines w19.69: -255.91,-55.12 -224.41,-55.12 -224.41,-9.84 -255.91,-9.84 ; 255.91,-55.12 224.41,-55.12 224.41,-9.84 255.91,-9.84

## 52746-15 [mil]
pads (15):
  rect 11.81x31.5 smd: 1(-137.8,23.62) 2(-118.11,23.62) 3(-98.43,23.62) 4(-78.74,23.62) 5(-59.06,23.62) 6(-39.37,23.62) 7(-19.69,23.62) 8(0,23.62) 9(19.69,23.62) 10(39.37,23.62) 11(59.06,23.62) 12(78.74,23.62) 13(98.43,23.62) 14(118.11,23.62) 15(137.8,23.62)
Top Layer:
  rectangle: -281.5,-78.74 -187.01,7.87
  rectangle: -238.19,-112.2 -187.01,-78.74
  rectangle: 187.01,-78.74 281.5,7.87
  rectangle: 187.01,-112.2 238.19,-78.74
Top Overlay:
  lines w8: -228.35,-157.48 -200.79,-157.48 -200.79,-196.85 -263.78,-196.85 -263.78,-204.72 ccw(c-248.03,-204.72) -248.03,-220.47 248.03,-220.47 ccw(c248.03,-204.72) 263.78,-204.72 263.78,-196.85 200.79,-196.85 200.79,-157.48 228.35,-157.48 ; -228.35,23.62 -157.48,23.62 ; 157.48,23.62 228.35,23.62
Top Paste:
  rectangle: -276.57,-74.8 -190.94,2.95
  rectangle: -234.25,-108.27 -190.94,-74.8
  rectangle: 190.94,-74.8 276.57,2.95
  rectangle: 190.94,-108.27 234.25,-74.8
Top Solder:
  rectangle: -281.5,-78.74 -187.01,7.87
  rectangle: -238.19,-112.2 -187.01,-78.74
  rectangle: 187.01,-78.74 281.5,7.87
  rectangle: 187.01,-112.2 238.19,-78.74
  rectangle: -144.69,6.89 -130.91,40.35
  rectangle: -125,6.89 -111.22,40.35
  rectangle: -105.32,6.89 -91.54,40.35
  rectangle: -85.63,6.89 -71.85,40.35
  rectangle: -65.94,6.89 -52.17,40.35
  rectangle: -46.26,6.89 -32.48,40.35
  rectangle: -26.57,6.89 -12.8,40.35
  rectangle: -6.89,6.89 6.89,40.35
  rectangle: 12.8,6.89 26.57,40.35
  rectangle: 32.48,6.89 46.26,40.35
  rectangle: 52.17,6.89 65.94,40.35
  rectangle: 71.85,6.89 85.63,40.35
  rectangle: 91.54,6.89 105.32,40.35
  rectangle: 111.22,6.89 125,40.35
  rectangle: 130.91,6.89 144.69,40.35
Mechanical 16:
  lines w8: -228.35,-157.48 -228.35,23.62 ; -157.48,23.62 157.48,23.62 ; 228.35,-157.48 228.35,23.62
  lines w19.69: -265.75,-55.12 -234.25,-55.12 -234.25,-9.84 -265.75,-9.84 ; 265.75,-55.12 234.25,-55.12 234.25,-9.84 265.75,-9.84